# Altium footprint library PowerProducts.PCBLIB: 166 footprints (part 7 of 11)
Each footprint in its own frame and in the unit in brackets; x right, y up, seen from the top. Pads: shape width x height; smd on the part's side, far side on the other; paste and mask are expansions set on the pad; w line width, h text height; cw(c..) or ccw(c..) is an arc to the next point about the centre after c.
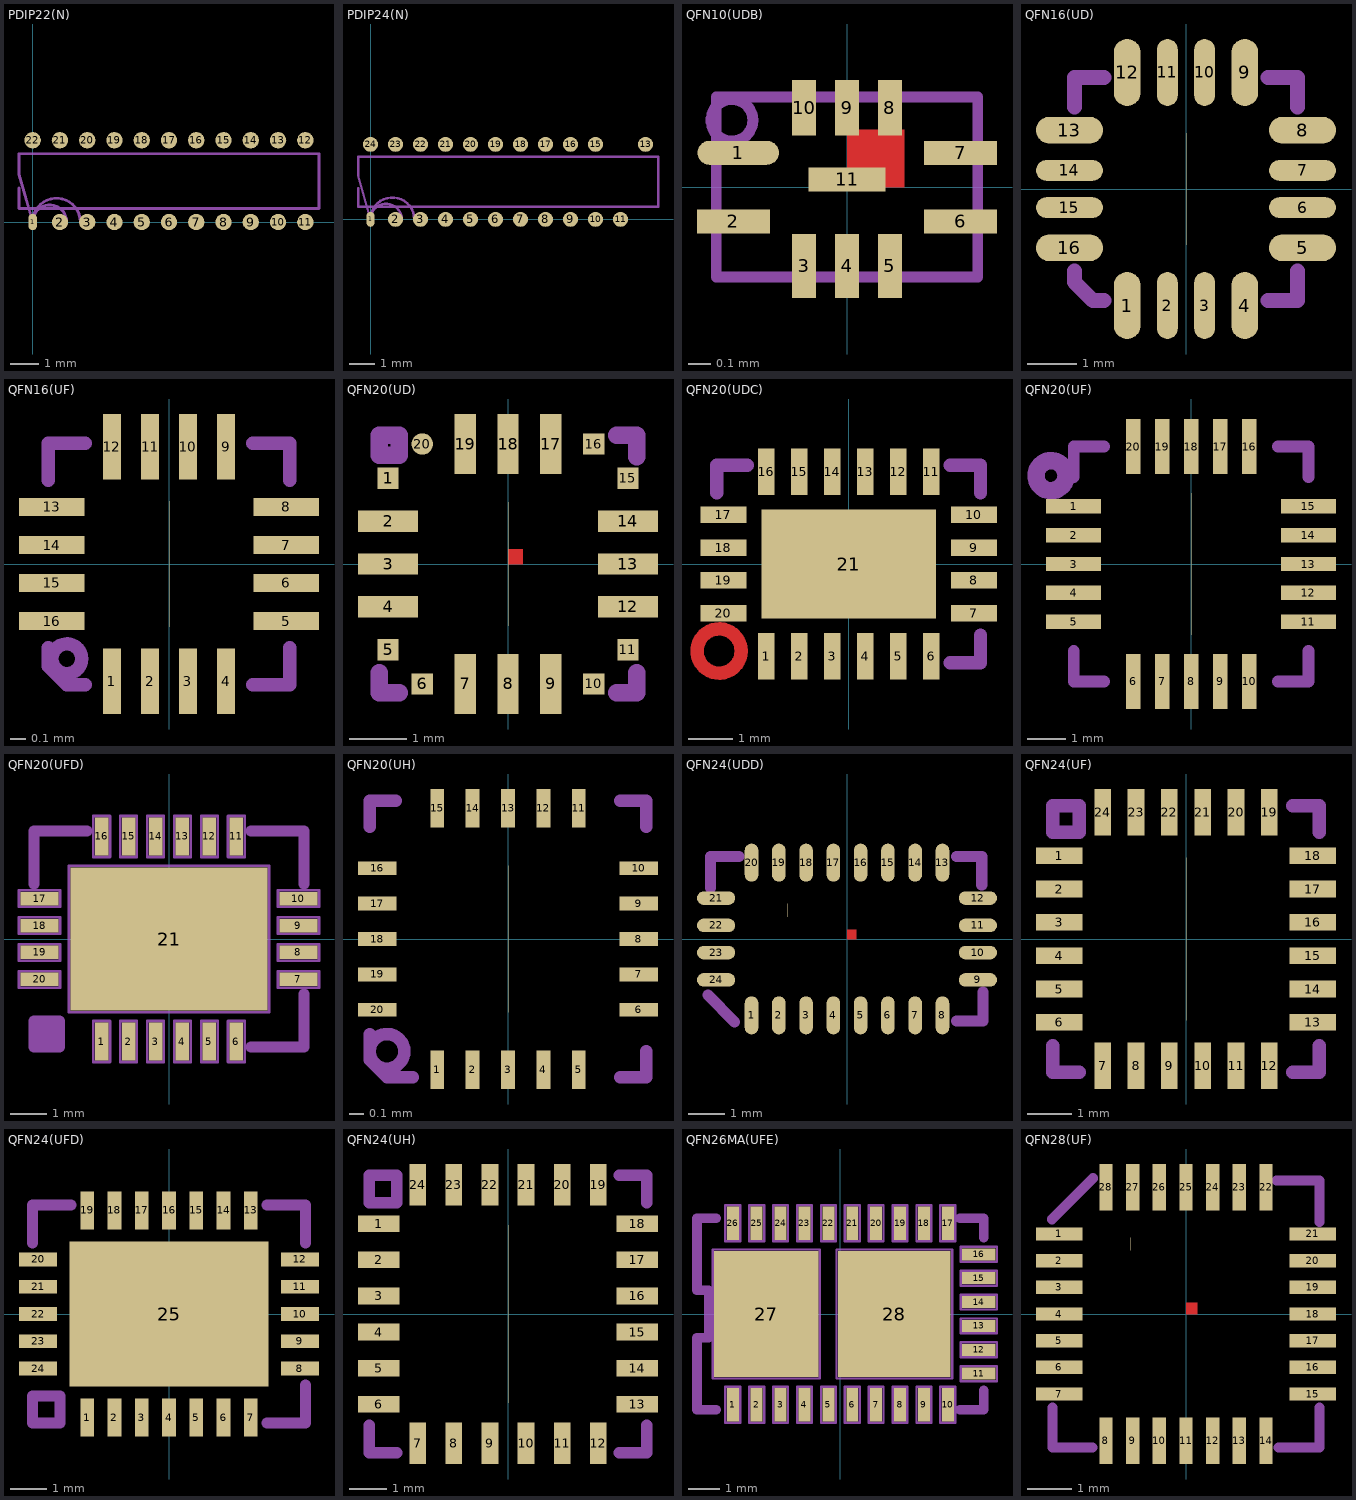
[diagram p6: the footprints below, top view; thin cyan lines are the x and y axes]

## PDIP22(N) [mil]
pads (22):
  rrect100% 12.19x22.86 smd: 1(0,0)
  rrect100% 22.86x22.86 smd: 2(38.1,0) 3(76.2,0) 4(114.3,0) 5(152.4,0) 6(190.5,0) 7(228.6,0) 8(266.7,0) 9(304.8,0) 10(342.9,0) 11(381,0) 12(381,114.3) 13(342.9,114.3) 14(304.8,114.3) 15(266.7,114.3) 16(228.6,114.3) 17(190.5,114.3) 18(152.4,114.3) 19(114.3,114.3) 20(76.2,114.3) 21(38.1,114.3) 22(0,114.3)
Mechanical 2:
  lines w3.81: -19.05,47.63 -19.05,19.05 400.05,19.05 400.05,95.25 -19.05,95.25 -19.05,66.68 0,0 ; 47.63,0 ccw(c23.82,0) 0,0 ; 66.68,0 ccw(c33.34,0) 0,0

## PDIP24(N) [mil]
pads (22):
  rrect100% 12.19x22.86 smd: 1(0,0)
  rrect100% 22.86x22.86 smd: 2(38.1,0) 3(76.2,0) 4(114.3,0) 5(152.4,0) 6(190.5,0) 7(228.6,0) 8(266.7,0) 9(304.8,0) 10(342.9,0) 11(381,0) 13(419.1,114.3) 15(342.9,114.3) 16(304.8,114.3) 17(266.7,114.3) 18(228.6,114.3) 19(190.5,114.3) 20(152.4,114.3) 21(114.3,114.3) 22(76.2,114.3) 23(38.1,114.3) 24(0,114.3)
Mechanical 2:
  lines w3.81: -19.05,47.63 -19.05,19.05 438.15,19.05 438.15,95.25 -19.05,95.25 -19.05,66.68 0,0 ; 47.63,0 ccw(c23.82,0) 0,0 ; 66.68,0 ccw(c33.34,0) 0,0

## QFN10(UDB) [mil]
pads (11):
  rrect100% 14.25x4.2 smd: 1(-19.05,6)
  rect 12.75x4.2 smd: 2(-19.88,-6) 6(19.88,-6) 7(19.88,6)
  rect 4.2x11.25 smd: 3(-7.5,-13.8) 4(0,-13.8) 5(7.5,-13.8)
  rect 4.2x9.75 smd: 8(7.5,13.88) 9(0,13.88) 10(-7.5,13.88)
  rect 13.5x4.2 smd: 11(0,1.35)
Top Layer:
  region: 0,0 10,0 10,10 0,10
  region: 0,0 10,0 10,10 0,10
Top Paste:
  region: 0,0 10,0 10,10 0,10
  region: 0,0 10,0 10,10 0,10
Top Solder:
  region: 0,0 10,0 10,10 0,10
  region: 0,0 10,0 10,10 0,10
Mechanical 2:
  circle w1.91: c-20.13,11.7 r3.66
  lines w1.91: -22.88,-15.75 -22.88,15.75 22.88,15.75 22.88,-15.75 -22.88,-15.75

## QFN16(UD) [mm]
pads (17):
  rrect100% 0.54x1.35 smd: 1(-1.185,-2.347) 4(1.185,-2.347) 9(1.185,2.347) 12(-1.185,2.347)
  rrect100% 0.42x1.35 smd: 2(-0.375,-2.347) 3(0.375,-2.347) 10(0.375,2.347) 11(-0.375,2.347)
  rrect100% 1.35x0.54 smd: 5(2.347,-1.185) 8(2.347,1.185) 13(-2.347,1.185) 16(-2.347,-1.185)
  rrect100% 1.35x0.42 smd: 6(2.347,-0.375) 7(2.347,0.375) 14(-2.347,0.375) 15(-2.347,-0.375)
  rrect100% 0x2.25 smd: 17(0,0)
Mechanical 2:
  lines w0.3: -2.25,-1.65 -2.25,-1.875 -1.875,-2.25 -1.65,-2.25 ; -2.25,1.65 -2.25,2.25 -1.65,2.25 ; 1.65,-2.25 2.25,-2.25 2.25,-1.65 ; 1.65,2.25 2.25,2.25 2.25,1.65

## QFN16(UF) [mil]
pads (17):
  rect 4.57x16.76 smd: 1(-14.62,-30.08) 2(-4.87,-30.08) 3(4.87,-30.08) 4(14.62,-30.08) 9(14.62,30.08) 10(4.87,30.08) 11(-4.87,30.08) 12(-14.62,30.08)
  rect 16.76x4.57 smd: 5(30.08,-14.62) 6(30.08,-4.87) 7(30.08,4.87) 8(30.08,14.62) 13(-30.08,14.62) 14(-30.08,4.87) 15(-30.08,-4.87) 16(-30.08,-14.62)
  rect 0x32.25 smd: 17(0,0)
Mechanical 2:
  circle w3.43: c-26.19,-24.29 r3.81
  circle w3.43: c-26.19,-24.29 r3.81
  lines w3.43: -30.96,-21.43 -30.96,-26.19 -26.19,-30.96 -21.43,-30.96 ; -30.96,21.43 -30.96,30.96 -21.43,30.96 ; 21.43,-30.96 30.96,-30.96 30.96,-21.43 ; 21.43,30.96 30.96,30.96 30.96,21.43

## QFN20(UD) [mm]
pads (21):
  rect 0.375x0.375 smd: 1(-2.1,1.5) 5(-2.1,-1.5) 6(-1.5,-2.1) 10(1.5,-2.1) 11(2.1,-1.5) 15(2.1,1.5) 16(1.5,2.1)
  rect 1.05x0.375 smd: 2(-2.1,0.75) 3(-2.1,0) 4(-2.1,-0.75) 12(2.1,-0.75) 13(2.1,0) 14(2.1,0.75)
  rect 0.375x1.05 smd: 7(-0.75,-2.1) 8(0,-2.1) 9(0.75,-2.1) 17(0.75,2.1) 18(0,2.1) 19(-0.75,2.1)
  rrect100% 0.375x0.375 smd: 20(-1.5,2.1)
  rrect100% 0x2.175 smd: 21(0,0)
Top Layer:
  region: 0,0 0.254,0 0.254,0.254 0,0.254
  region: 0,0 0.254,0 0.254,0.254 0,0.254
  region: 0,0 0.254,0 0.254,0.254 0,0.254
  region: 0,0 0.254,0 0.254,0.254 0,0.254
  region: 0,0 0.254,0 0.254,0.254 0,0.254
  region: 0,0 0.254,0 0.254,0.254 0,0.254
  region: 0,0 0.254,0 0.254,0.254 0,0.254
  region: 0,0 0.254,0 0.254,0.254 0,0.254
Top Paste:
  region: 0,0 0.254,0 0.254,0.254 0,0.254
  region: 0,0 0.254,0 0.254,0.254 0,0.254
  region: 0,0 0.254,0 0.254,0.254 0,0.254
  region: 0,0 0.254,0 0.254,0.254 0,0.254
  region: 0,0 0.254,0 0.254,0.254 0,0.254
  region: 0,0 0.254,0 0.254,0.254 0,0.254
  region: 0,0 0.254,0 0.254,0.254 0,0.254
  region: 0,0 0.254,0 0.254,0.254 0,0.254
Top Solder:
  region: 0,0 0.254,0 0.254,0.254 0,0.254
  region: 0,0 0.254,0 0.254,0.254 0,0.254
  region: 0,0 0.254,0 0.254,0.254 0,0.254
  region: 0,0 0.254,0 0.254,0.254 0,0.254
  region: 0,0 0.254,0 0.254,0.254 0,0.254
  region: 0,0 0.254,0 0.254,0.254 0,0.254
  region: 0,0 0.254,0 0.254,0.254 0,0.254
  region: 0,0 0.254,0 0.254,0.254 0,0.254
Mechanical 2:
  lines w0.305: -2.25,-1.905 -2.25,-2.25 -1.905,-2.25 ; 1.905,-2.25 2.25,-2.25 2.25,-1.905 ; 1.905,2.25 2.25,2.25 2.25,1.875 ; -2.25,1.905 -1.905,1.905 -1.905,2.25 -2.25,2.25 -2.25,1.905

## QFN20(UDC) [mil]
pads (21):
  rect 14.76x41.34 smd: 1(-73.82,-82.68) 2(-44.29,-82.68) 3(-14.76,-82.68) 4(14.76,-82.68) 5(44.29,-82.68) 6(73.82,-82.68) 11(73.82,82.68) 12(44.29,82.68) 13(14.76,82.68) 14(-14.76,82.68) 15(-44.29,82.68) 16(-73.82,82.68)
  rect 41.34x14.76 smd: 7(112.2,-44.29) 8(112.2,-14.76) 9(112.2,14.76) 10(112.2,44.29) 17(-112.2,44.29) 18(-112.2,14.76) 19(-112.2,-14.76) 20(-112.2,-44.29)
  rect 156.5x97.44 smd: 21(0,0)
Top Layer:
  circle w12: c-116.02,-77.94 r19.8
Mechanical 2:
  lines w12: -118.11,63.78 -118.11,88.58 -90.94,88.58 ; 90.94,-88.58 118.11,-88.58 118.11,-63.78 ; 90.94,88.58 118.11,88.58 118.11,63.78

## QFN20(UF) [mil]
pads (21):
  rect 56.1x14.76 smd: 1(-119.59,59.06) 2(-119.59,29.53) 3(-119.59,0) 4(-119.59,-29.53) 5(-119.59,-59.06) 11(119.59,-59.06) 12(119.59,-29.53) 13(119.59,0) 14(119.59,29.53) 15(119.59,59.06)
  rect 14.76x56.1 smd: 6(-59.06,-119.59) 7(-29.53,-119.59) 8(0,-119.59) 9(29.53,-119.59) 10(59.06,-119.59) 16(59.06,119.59) 17(29.53,119.59) 18(0,119.59) 19(-29.53,119.59) 20(-59.06,119.59)
  rect 0x144.69 smd: 21(0,0)
Mechanical 2:
  circle w17.72: c-142.65,90 r15.3
  lines w12: -119.59,-88.58 -119.59,-119.59 -88.58,-119.59 ; -119.59,88.58 -119.59,119.59 -88.58,119.59 ; 88.58,-119.59 119.59,-119.59 119.59,-88.58 ; 88.58,119.59 119.59,119.59 119.59,88.58

## QFN20(UFD) [mil]
pads (21):
  rect 14.76x41.34 smd: 1(-73.82,-112.2) 2(-44.29,-112.2) 3(-14.76,-112.2) 4(14.76,-112.2) 5(44.29,-112.2) 6(73.82,-112.2) 11(73.82,112.2) 12(44.29,112.2) 13(14.76,112.2) 14(-14.76,112.2) 15(-44.29,112.2) 16(-73.82,112.2)
  rect 41.34x14.76 smd: 7(141.73,-44.29) 8(141.73,-14.76) 9(141.73,14.76) 10(141.73,44.29) 17(-141.73,44.29) 18(-141.73,14.76) 19(-141.73,-14.76) 20(-141.73,-44.29)
  rect 215.55x156.5 smd: 21(0,0)
Mechanical 2:
  lines w2.95: -164.17,-53.44 -119.29,-53.44 -119.29,-35.14 -164.17,-35.14 -164.17,-53.44 ; -164.17,-23.92 -119.29,-23.92 -119.29,-5.61 -164.17,-5.61 -164.17,-23.92 ; -164.17,5.61 -119.29,5.61 -119.29,23.92 -164.17,23.92 -164.17,5.61 ; -164.17,35.14 -119.29,35.14 -119.29,53.44 -164.17,53.44 -164.17,35.14 ; -109.55,-80.02 109.55,-80.02 109.55,80.02 -109.55,80.02 -109.55,-80.02 ; -82.97,-134.65 -82.97,-89.76 -64.67,-89.76 -64.67,-134.65 -82.97,-134.65 ; -82.97,89.76 -82.97,134.65 -64.67,134.65 -64.67,89.76 -82.97,89.76 ; -53.44,-134.65 -53.44,-89.76 -35.14,-89.76 -35.14,-134.65 -53.44,-134.65 ; -53.44,89.76 -53.44,134.65 -35.14,134.65 -35.14,89.76 -53.44,89.76 ; -23.92,-134.65 -23.92,-89.76 -5.61,-89.76 -5.61,-134.65 -23.92,-134.65 ; -23.92,89.76 -23.92,134.65 -5.61,134.65 -5.61,89.76 -23.92,89.76 ; 5.61,-134.65 5.61,-89.76 23.92,-89.76 23.92,-134.65 5.61,-134.65 ; 5.61,89.76 5.61,134.65 23.92,134.65 23.92,89.76 5.61,89.76 ; 35.14,-134.65 35.14,-89.76 53.44,-89.76 53.44,-134.65 35.14,-134.65 ; 35.14,89.76 35.14,134.65 53.44,134.65 53.44,89.76 35.14,89.76 ; 64.67,-134.65 64.67,-89.76 82.97,-89.76 82.97,-134.65 64.67,-134.65 ; 64.67,89.76 64.67,134.65 82.97,134.65 82.97,89.76 64.67,89.76 ; 119.29,-53.44 164.17,-53.44 164.17,-35.14 119.29,-35.14 119.29,-53.44 ; 119.29,-23.92 164.17,-23.92 164.17,-5.61 119.29,-5.61 119.29,-23.92 ; 119.29,5.61 164.17,5.61 164.17,23.92 119.29,23.92 119.29,5.61 ; 119.29,35.14 164.17,35.14 164.17,53.44 119.29,53.44 119.29,35.14
  lines w12: -147.64,60 -147.64,118.11 -90,118.11 ; 90,-118.11 147.64,-118.11 147.64,-60 ; 90,118.11 147.64,118.11 147.64,60 ; -147.64,-118.11 -120,-118.11 -120,-90 -147.64,-90 -147.64,-118.11
  lines w15: -142.5,-112.5 -123.75,-93.75 ; -142.5,-93.75 -123.75,-112.5

## QFN20(UH) [mil]
pads (21):
  rect 3.81x10.67 smd: 1(-19.49,-36) 2(-9.75,-36) 3(0,-36) 4(9.75,-36) 5(19.49,-36) 11(19.49,36) 12(9.75,36) 13(0,36) 14(-9.75,36) 15(-19.49,36)
  rect 10.67x3.81 smd: 6(36,-19.49) 7(36,-9.75) 8(36,0) 9(36,9.75) 10(36,19.49) 16(-36,19.49) 17(-36,9.75) 18(-36,0) 19(-36,-9.75) 20(-36,-19.49)
  rect 0x40.39 smd: 21(0,0)
Mechanical 2:
  circle w3.43: c-33.34,-30.96 r4.76
  lines w3.43: -38.1,-26.19 -38.1,-33.34 -33.34,-38.1 -26.19,-38.1 ; -38.1,30.96 -38.1,38.1 -30.96,38.1 ; 30.96,-38.1 38.1,-38.1 38.1,-30.96 ; 30.96,38.1 38.1,38.1 38.1,30.96

## QFN24(UDD) [mm]
pads (25):
  rrect100% 0.375x1.05 smd: 1(-2.625,-2.1) 2(-1.875,-2.1) 3(-1.125,-2.1) 4(-0.375,-2.1) 5(0.375,-2.1) 6(1.125,-2.1) 7(1.875,-2.1) 8(2.625,-2.1) 13(2.625,2.1) 14(1.875,2.1) 15(1.125,2.1) 16(0.375,2.1) 17(-0.375,2.1) 18(-1.125,2.1) 19(-1.875,2.1) 20(-2.625,2.1)
  rrect100% 1.05x0.375 smd: 9(3.6,-1.125) 10(3.6,-0.375) 11(3.6,0.375) 12(3.6,1.125) 21(-3.6,1.125) 22(-3.6,0.375) 23(-3.6,-0.375) 24(-3.6,-1.125)
  rrect100% 0x0.375 smd: 25(-1.65,0.795)
Top Layer:
  region: 0,0 0.254,0 0.254,0.254 0,0.254
Top Paste:
  region: 0,0 0.254,0 0.254,0.254 0,0.254
Top Solder:
  region: 0,0 0.254,0 0.254,0.254 0,0.254
Mechanical 2:
  lines w0.305: -3.825,-1.545 -3.09,-2.28 ; -3.75,1.41 -3.75,2.265 -2.97,2.265 ; 3.015,-2.25 3.735,-2.25 3.735,-1.455 ; 3.015,2.265 3.705,2.265 3.705,1.485

## QFN24(UF) [mil]
pads (25):
  rect 41.34x14.76 smd: 1(-112.2,73.82) 2(-112.2,44.29) 3(-112.2,14.76) 4(-112.2,-14.76) 5(-112.2,-44.29) 6(-112.2,-73.82) 13(112.2,-73.82) 14(112.2,-44.29) 15(112.2,-14.76) 16(112.2,14.76) 17(112.2,44.29) 18(112.2,73.82)
  rect 14.76x41.34 smd: 7(-73.82,-112.2) 8(-44.29,-112.2) 9(-14.76,-112.2) 10(14.76,-112.2) 11(44.29,-112.2) 12(73.82,-112.2) 19(73.82,112.2) 20(44.29,112.2) 21(14.76,112.2) 22(-14.76,112.2) 23(-44.29,112.2) 24(-73.82,112.2)
  rect 0x144.69 smd: 25(0,0)
Mechanical 2:
  lines w12: -118.11,-94.49 -118.11,-118.11 -94.49,-118.11 ; 94.49,-118.11 118.11,-118.11 118.11,-94.49 ; 94.49,118.11 118.11,118.11 118.11,94.49 ; -118.11,94.49 -94.49,94.49 -94.49,118.11 -118.11,118.11 -118.11,94.49

## QFN24(UFD) [mil]
pads (25):
  rect 14.76x41.34 smd: 1(-88.58,-112.2) 2(-59.06,-112.2) 3(-29.53,-112.2) 4(0,-112.2) 5(29.53,-112.2) 6(59.06,-112.2) 7(88.58,-112.2) 13(88.58,112.2) 14(59.06,112.2) 15(29.53,112.2) 16(0,112.2) 17(-29.53,112.2) 18(-59.06,112.2) 19(-88.58,112.2)
  rect 41.34x14.76 smd: 8(141.73,-59.06) 9(141.73,-29.53) 10(141.73,0) 11(141.73,29.53) 12(141.73,59.06) 20(-141.73,59.06) 21(-141.73,29.53) 22(-141.73,0) 23(-141.73,-29.53) 24(-141.73,-59.06)
  rect 215.55x156.5 smd: 25(0,0)
Mechanical 2:
  lines w12: -147.64,76.77 -147.64,118.11 -106.3,118.11 ; 106.3,-118.11 147.64,-118.11 147.64,-76.77 ; 106.3,118.11 147.64,118.11 147.64,76.77 ; -147.64,-118.11 -118.11,-118.11 -118.11,-88.58 -147.64,-88.58 -147.64,-118.11

## QFN24(UH) [mil]
pads (25):
  rect 44.29x17.72 smd: 1(-137.3,95.96) 2(-137.3,57.58) 3(-137.3,19.19) 4(-137.3,-19.19) 5(-137.3,-57.58) 6(-137.3,-95.96) 13(137.3,-95.96) 14(137.3,-57.58) 15(137.3,-19.19) 16(137.3,19.19) 17(137.3,57.58) 18(137.3,95.96)
  rect 17.72x44.29 smd: 7(-95.96,-137.3) 8(-57.58,-137.3) 9(-19.19,-137.3) 10(19.19,-137.3) 11(57.58,-137.3) 12(95.96,-137.3) 19(95.96,137.3) 20(57.58,137.3) 21(19.19,137.3) 22(-19.19,137.3) 23(-57.58,137.3) 24(-95.96,137.3)
  rect 0x188.98 smd: 25(0,0)
Mechanical 2:
  lines w12: -147.64,-118.11 -147.64,-147.64 -118.11,-147.64 ; 118.11,-147.64 147.64,-147.64 147.64,-118.11 ; 118.11,147.64 147.64,147.64 147.64,118.11 ; -147.64,118.11 -118.11,118.11 -118.11,147.64 -147.64,147.64 -147.64,118.11

## QFN26MA(UFE) [mm]
pads (28):
  rect 0.375x1.05 smd: 1(-3.375,-2.85) 2(-2.625,-2.85) 3(-1.875,-2.85) 4(-1.125,-2.85) 5(-0.375,-2.85) 6(0.375,-2.85) 7(1.125,-2.85) 8(1.875,-2.85) 9(2.625,-2.85) 10(3.375,-2.85) 17(3.375,2.85) 18(2.625,2.85) 19(1.875,2.85) 20(1.125,2.85) 21(0.375,2.85) 22(-0.375,2.85) 23(-1.125,2.85) 24(-1.875,2.85) 25(-2.625,2.85) 26(-3.375,2.85)
  rect 1.05x0.375 smd: 11(4.35,-1.875) 12(4.35,-1.125) 13(4.35,-0.375) 14(4.35,0.375) 15(4.35,1.125) 16(4.35,1.875)
  rect 3.27x3.96 smd: 27(-2.325,0)
  rect 3.54x3.96 smd: 28(1.695,0)
Mechanical 2:
  lines w0.075: -4.005,-2.025 -4.005,2.025 -0.645,2.025 -0.645,-2.025 -4.005,-2.025 ; -3.608,-3.42 -3.608,-2.28 -3.142,-2.28 -3.142,-3.42 -3.608,-3.42 ; -3.608,2.28 -3.608,3.42 -3.142,3.42 -3.142,2.28 -3.608,2.28 ; -2.857,-3.42 -2.857,-2.28 -2.392,-2.28 -2.392,-3.42 -2.857,-3.42 ; -2.857,2.28 -2.857,3.42 -2.392,3.42 -2.392,2.28 -2.857,2.28 ; -2.107,-3.42 -2.107,-2.28 -1.643,-2.28 -1.643,-3.42 -2.107,-3.42 ; -2.107,2.28 -2.107,3.42 -1.643,3.42 -1.643,2.28 -2.107,2.28 ; -1.357,-3.42 -1.357,-2.28 -0.893,-2.28 -0.893,-3.42 -1.357,-3.42 ; -1.357,2.28 -1.357,3.42 -0.893,3.42 -0.893,2.28 -1.357,2.28 ; -0.608,-3.42 -0.608,-2.28 -0.142,-2.28 -0.142,-3.42 -0.608,-3.42 ; -0.608,2.28 -0.608,3.42 -0.142,3.42 -0.142,2.28 -0.608,2.28 ; -0.12,-2.025 -0.12,2.025 3.51,2.025 3.51,-2.025 -0.12,-2.025 ; 0.142,-3.42 0.142,-2.28 0.608,-2.28 0.608,-3.42 0.142,-3.42 ; 0.142,2.28 0.142,3.42 0.608,3.42 0.608,2.28 0.142,2.28 ; 0.893,-3.42 0.893,-2.28 1.357,-2.28 1.357,-3.42 0.893,-3.42 ; 0.893,2.28 0.893,3.42 1.357,3.42 1.357,2.28 0.893,2.28 ; 1.643,-3.42 1.643,-2.28 2.107,-2.28 2.107,-3.42 1.643,-3.42 ; 1.643,2.28 1.643,3.42 2.107,3.42 2.107,2.28 1.643,2.28 ; 2.392,-3.42 2.392,-2.28 2.857,-2.28 2.857,-3.42 2.392,-3.42 ; 2.392,2.28 2.392,3.42 2.857,3.42 2.857,2.28 2.392,2.28 ; 3.142,-3.42 3.142,-2.28 3.608,-2.28 3.608,-3.42 3.142,-3.42 ; 3.142,2.28 3.142,3.42 3.608,3.42 3.608,2.28 3.142,2.28 ; 3.78,-2.107 4.92,-2.107 4.92,-1.643 3.78,-1.643 3.78,-2.107 ; 3.78,-1.357 4.92,-1.357 4.92,-0.893 3.78,-0.893 3.78,-1.357 ; 3.78,-0.608 4.92,-0.608 4.92,-0.142 3.78,-0.142 3.78,-0.608 ; 3.78,0.142 4.92,0.142 4.92,0.608 3.78,0.608 3.78,0.142 ; 3.78,0.893 4.92,0.893 4.92,1.357 3.78,1.357 3.78,0.893 ; 3.78,1.643 4.92,1.643 4.92,2.107 3.78,2.107 3.78,1.643
  lines w0.3: -3.9,-3 -4.5,-3 -4.5,-0.75 -4.125,-0.75 -4.125,0.75 -4.5,0.75 -4.5,3 -3.9,3 ; 3.75,-3 4.5,-3 4.5,-2.4 ; 3.75,3 4.5,3 4.5,2.4

## QFN28(UF) [mil]
pads (29):
  rect 41.34x11.81 smd: 1(-112.2,70.87) 2(-112.2,47.24) 3(-112.2,23.62) 4(-112.2,0) 5(-112.2,-23.62) 6(-112.2,-47.24) 7(-112.2,-70.87) 15(112.2,-70.87) 16(112.2,-47.24) 17(112.2,-23.62) 18(112.2,0) 19(112.2,23.62) 20(112.2,47.24) 21(112.2,70.87)
  rect 11.81x41.34 smd: 8(-70.87,-112.2) 9(-47.24,-112.2) 10(-23.62,-112.2) 11(0,-112.2) 12(23.62,-112.2) 13(47.24,-112.2) 14(70.87,-112.2) 22(70.87,112.2) 23(47.24,112.2) 24(23.62,112.2) 25(0,112.2) 26(-23.62,112.2) 27(-47.24,112.2) 28(-70.87,112.2)
  rect 0x11.81 smd: 29(-49.02,62.01)
Top Layer:
  region: 0,0 10,0 10,10 0,10
  region: 0,0 10,0 10,10 0,10
  region: 0,0 10,0 10,10 0,10
  region: 0,0 10,0 10,10 0,10
  region: 0,0 10,0 10,10 0,10
Top Paste:
  region: 0,0 10,0 10,10 0,10
  region: 0,0 10,0 10,10 0,10
  region: 0,0 10,0 10,10 0,10
  region: 0,0 10,0 10,10 0,10
  region: 0,0 10,0 10,10 0,10
Top Solder:
  region: 0,0 10,0 10,10 0,10
  region: 0,0 10,0 10,10 0,10
  region: 0,0 10,0 10,10 0,10
  region: 0,0 10,0 10,10 0,10
  region: 0,0 10,0 10,10 0,10
Mechanical 2:
  lines w9: -118.7,83.86 -82.38,120.18 ; -118.11,-82.68 -118.11,-118.11 -82.68,-118.11 ; 80.32,118.11 118.11,118.11 118.11,81.5 ; 82.09,-118.11 118.11,-118.11 118.11,-82.68